# Altium footprint library LUMI_Handy_Soldering_LIB.PcbLib: 562 footprints (part 5 of 36)
Each footprint in its own frame and in the unit in brackets; x right, y up, seen from the top. Pads: shape width x height; smd on the part's side, far side on the other; paste and mask are expansions set on the pad; w line width, h text height; cw(c..) or ccw(c..) is an arc to the next point about the centre after c.
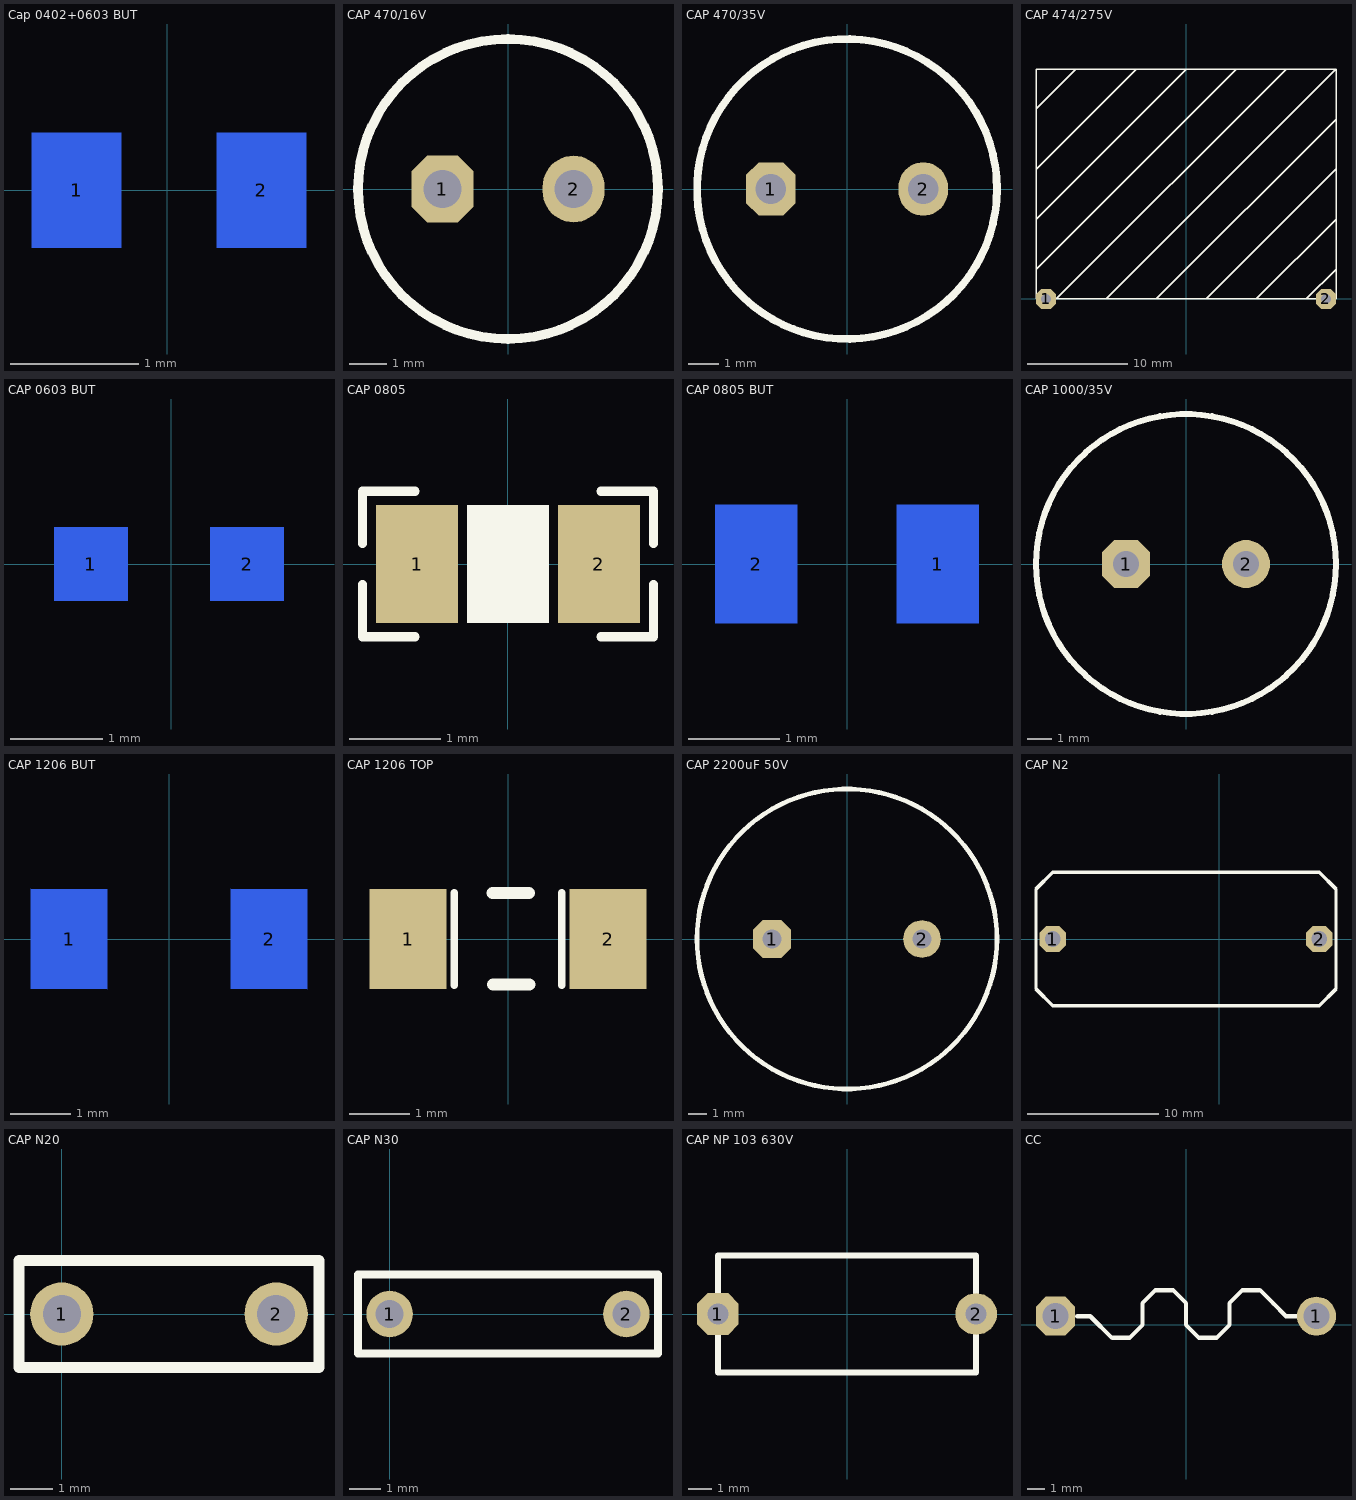
[diagram p4: the footprints below, top view; thin cyan lines are the x and y axes]

## Cap 0402+0603 BUT [mm]
pads (2):
  rect 0.7x0.9 smd far side: 1(-0.711,0) 2(0.737,0)
Bottom Overlay:
  rectangle: -0.356,-0.5 0,0.55
  lines w0.127: 0.321,-0.508 0.321,0.483 ; -1.143,-0.533 -1.143,0.533 1.168,0.533 1.168,-0.533 -1.143,-0.533
3D body: height 0.7, standoff 0, extent -0.8,-0.4 0.8,0.4

## CAP 470/16V [mil]
pads (2):
  oct 65x70 hole 40: 1(-68.9,0)
  oval 65x70 hole 40: 2(68.9,0)
Top Overlay:
  circle w10: c0,0 r157.48
3D body: height 477.44, standoff -93.43, extent -156.49,-158.46 158.47,156.5

## CAP 470/35V [mil]
pads (2):
  oct 65x70 hole 40: 1(-100,0)
  oval 65x70 hole 40: 2(100,0)
Top Overlay:
  circle w10: c0,0 r196.85
3D body: height 472.44, standoff -98.43, extent -196.84,-196.84 196.86,196.86

## CAP 474/275V [mm]
pads (2):
  oct 2x2 hole 1: 1(-14,0) 2(14,0)
Top Overlay:
  lines w0.127: -15,3 5,23 ; -15,8 0,23 ; -15,13 -5,23 ; -15,19 -11,23 -10,23 ; -13,0 10,23 ; -3,0 15,18 ; 7,0 15,8 ; 15,3 12,0 ; -8,0 15,23 ; -8,0 -8,0 ; 2,0 15,13 ; 2,0 2,0 ; 12,0 12,0 ; 15,13 15,13 ; 15,23 15,0 -15,0 -15,23 15,23 ; 15,23 15,23

## CAP 0603 BUT [mm]
pads (2):
  rect 0.8x0.8 smd far side: 1(-0.875,0) 2(0.825,0)
Bottom Overlay:
  lines w0.127: -1.656,-0.781 1.225,-0.781 1.606,-0.781 1.606,0.4 1.606,0.781 -1.656,0.781 -1.656,0.4 -1.656,-0.4 -1.656,-0.781
3D body: height 0.7, standoff 0, extent -0.8,-0.4 0.8,0.4

## CAP 0805 [mm]
pads (2):
  rect 0.9x1.3 smd: 1(-1,0) 2(1,0)
Top Overlay:
  rectangle: -0.45,-0.65 0.45,0.65
  lines w0.1: -1.6,-0.225 -1.6,-0.8 -1.025,-0.8 ; -1.6,0.225 -1.6,0.8 -1.025,0.8 ; 1.025,-0.8 1.6,-0.8 1.6,-0.225 ; 1.025,0.8 1.6,0.8 1.6,0.225
3D body: height 0.8, standoff 0.02, extent -1,-0.625 1,0.625

## CAP 0805 BUT [mm]
pads (2):
  rect 0.9x1.3 smd far side: 1(1,0) 2(-1,0)
Bottom Overlay:
  region: 0.45,0.65 -0.45,0.65 -0.45,-0.65 0.45,-0.65
  lines w0.1: -1.6,-0.225 -1.6,-0.8 -1.025,-0.8 ; -1.6,0.225 -1.6,0.8 -1.025,0.8 ; 1.025,-0.8 1.6,-0.8 1.6,-0.225 ; 1.025,0.8 1.6,0.8 1.6,0.225
3D body: height 0.8, standoff 0.02, extent -1,-0.625 1,0.625

## CAP 1000/35V [mm]
pads (2):
  oct 2x2 hole 1.1: 1(-2.5,0)
  round 2 hole 1.1: 2(2.5,0)
Top Overlay:
  circle w0.254: c0,0 r6.25
3D body: height 19.99, standoff -19, extent -6.275,-6.2 6.225,6.3

## CAP 1206 BUT [mil]
pads (2):
  rect 50x65 smd far side: 1(-65,0) 2(65,0)
Bottom Overlay:
  lines w5: -35,-30 -35,30 ; 35,-30 35,30
3D body: height -15, standoff -54.45, extent -62.99,-31.49 63,31.5

## CAP 1206 TOP [mil]
pads (2):
  rect 50x65 smd: 1(-65,0) 2(65,0)
Top Overlay:
  lines w5: -35,-30 -35,30 ; 35,-30 35,30
  lines w7.87: -10,30 13.62,30 ; -9.81,-29.5 13.81,-29.5
3D body: height 39.45, standoff 0, extent -62.99,-31.49 63,31.5

## CAP 2200uF 50V [mm]
pads (2):
  oct 2x2 hole 1.016: 1(-4,0)
  round 2 hole 1.016: 2(4,0)
Top Overlay:
  circle w0.254: c0,0 r8
3D body: height 25, standoff -19, extent -8,-8 8,8

## CAP N2 [mm]
pads (2):
  oct 2x2 hole 1.2: 1(-12.7,0) 2(7.62,0)
Top Overlay:
  lines w0.254: -13.97,-3.81 -12.7,-5.08 7.62,-5.08 8.89,-3.81 8.89,3.81 7.62,5.08 -12.7,5.08 -13.97,3.81 -13.97,-3.81
3D body: height 17.16, standoff -9.33, extent -12.25,-3 6.25,3.8

## CAP N20 [mm]
pads (2):
  round 1.5 hole 0.9: 1(0,0) 2(5.08,0)
Top Overlay:
  lines w0.254: -1.016,-1.27 -1.016,1.27 6.096,1.27 6.096,-1.27 -1.016,-1.27

## CAP N30 [mm]
pads (2):
  round 1.5 hole 0.9: 1(0,0) 2(7.62,0)
Top Overlay:
  lines w0.254: -1.016,-1.27 -1.016,1.27 8.636,1.27 8.636,-1.27 -1.016,-1.27

## CAP NP 103 630V [mil]
pads (2):
  oct 70x70 hole 35: 1(-216.54,0)
  round 70 hole 35: 2(216.54,0)
Top Overlay:
  lines w10: -216.54,-98.43 216.54,-98.43 216.54,98.43 -216.54,98.43 -216.54,-98.43

## CC [mil]
pads (2):
  oct 90x90 hole 60: 1(-300,20)
  round 90 hole 60: 1(300,20)
Top Overlay:
  lines w10: -250,20 -220,20 -170,-30 -130,-30 -100,0 -100,50 -70,80 -30,80 0,50 0,0 30,-30 70,-30 100,0 100,50 130,80 170,80 200,50 230,20 260,20